# Altium footprint library PCBLIB.PcbLib: 775 footprints (part 48 of 49)
Each footprint in its own frame and in the unit in brackets; x right, y up, seen from the top. Pads: shape width x height; smd on the part's side, far side on the other; paste and mask are expansions set on the pad; w line width, h text height; cw(c..) or ccw(c..) is an arc to the next point about the centre after c.
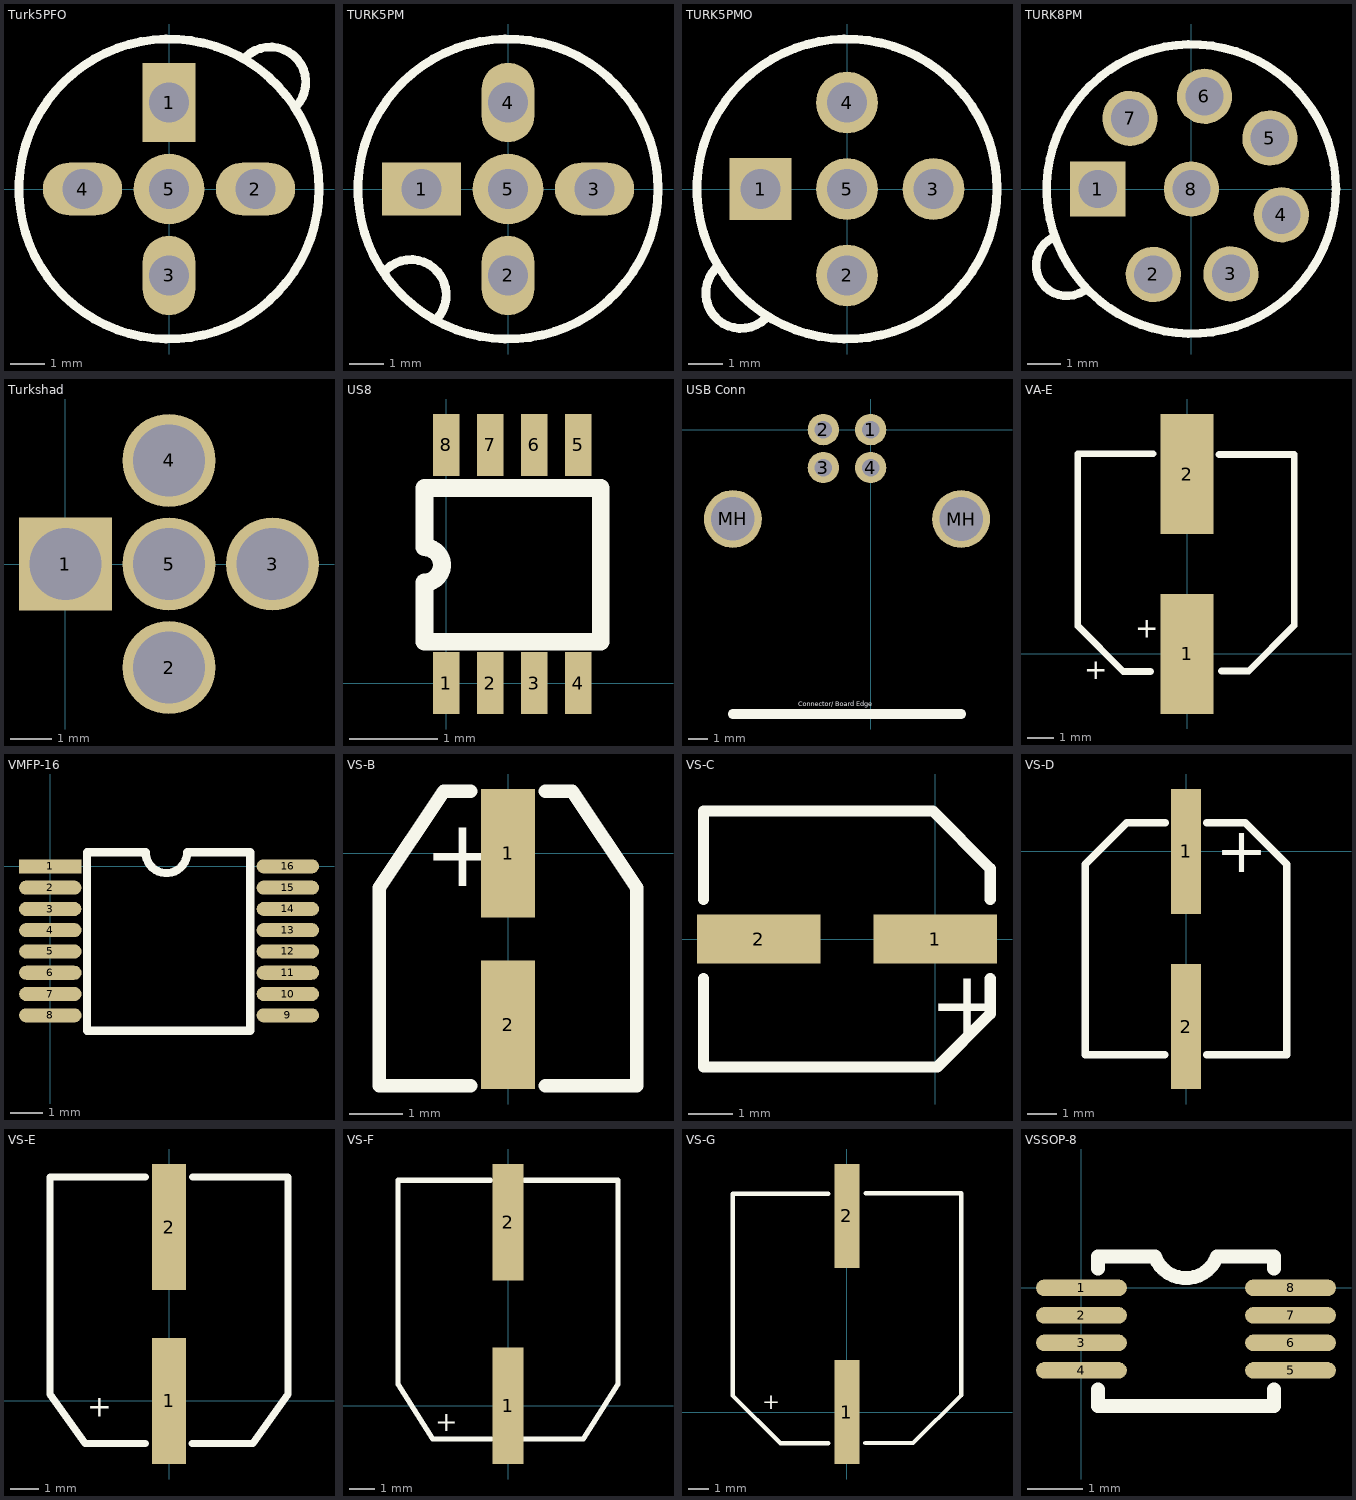
[diagram p47: the footprints below, top view; thin cyan lines are the x and y axes]

## Turk5PFO [mil]
pads (5):
  rect 60x90 hole 45: 1(0,98)
  oval 90x60 hole 45: 2(98,0) 4(-98,0)
  oval 60x90 hole 45: 3(0,-98)
  round 80 hole 45: 5(0,0)
TopOverlay:
  circle w10: c0,0 r170
  lines w10: 86.72,149.28 cw(c115,121) 143.28,92.72
Mechanical4:
  text "1.083" at 0,0 h1
  text "1.370" at 0,98 h1

## TURK5PM [mil]
pads (5):
  rect 90x60 hole 45: 1(-98,0)
  oval 60x90 hole 45: 2(0,-98) 4(0,98)
  oval 90x60 hole 45: 3(98,0)
  round 80 hole 45: 5(0,0)
TopOverlay:
  circle w10: c0,0 r170
  lines w10: -138.28,-91.72 cw(c-110,-120) -81.72,-148.28
Mechanical4:
  text "1.370" at -98,0 h1
  text "1.083" at 0,0 h1

## TURK5PMO [mil]
pads (5):
  rect 70x70 hole 45: 1(-98,0)
  round 70 hole 45: 2(0,-98) 3(98,0) 4(0,98) 5(0,0)
TopOverlay:
  circle w10: c0,0 r170
  lines w10: -148.28,-89.72 ccw(c-120,-118) -91.72,-146.28
BottomOverlay:
  circle w10: c0,0 r170
  lines w10: -148.28,-89.72 ccw(c-120,-118) -91.72,-146.28
Mechanical4:
  text "1.370" at -98,0 h1
  text "1.083" at 0,0 h1

## TURK8PM [mil]
pads (8):
  rect 65x65 hole 45: 1(-110,0)
  round 65 hole 45: 2(-44.74,-100.49) 3(46.49,-99.69) 4(105.74,-30.32) 5(92.25,59.91) 6(15.31,108.93) 7(-72.17,83.02) 8(0,0)
TopOverlay:
  circle w10: c0,0 r170
  lines w10: -163.45,-57.43 ccw(c-146.45,-89.43) -127,-120
Mechanical4:
  text "1.370" at 0,0 h1

## Turkshad [mil]
pads (5):
  rect 88x88 hole 68: 1(0,0)
  round 88 hole 68: 2(98,-98) 3(196,0) 4(98,98) 5(98,0)
Mechanical4:
  text "1.083" at 98,0 h1
  text ".4" at 0,0 h1

## US8 [mm]
pads (8):
  rect 0.3x0.7 smd: 1(0,0) 2(0.5,0) 3(1,0) 4(1.5,0) 5(1.5,2.7) 6(1,2.7) 7(0.5,2.7) 8(0,2.7)
TopOverlay:
  lines w0.203: -0.247,0.469 1.753,0.469 1.753,2.21 -0.247,2.21 -0.247,1.54 cw(c-0.247,1.34) -0.247,1.14 -0.247,0.469

## USB Conn [mil]
pads (6):
  round 65 hole 36.2: 1(0,0) 2(-98.4,0) 3(-98.4,-78.7) 4(0,-78.7)
  round 120 hole 90.6: MH(-286.22,-185.43) MH(187.8,-185.63)
TopOverlay:
  lines w20: -286.22,-590.55 187.79,-590.55
  text "Connector/ Board Edge" at -150.6,-573.96 h10

## VA-E [mil]
pads (2):
  rect 78x177.16 smd: 1(0,0) 2(0,265)
TopOverlay:
  lines w10: -54,-26 -94,-26 -161,41 -161,295 -50,295 ; 47,294 158,294 158,42 91,-25 51,-25
  text "+" at -76,24 h30
  text "+" at -151.57,-37.24 h30

## VMFP-16 [mm]
height 2
pads (16):
  rect 1.905x0.43 smd: 1(0,0)
  oval 1.905x0.43 smd: 2(-0.003,-0.65) 3(-0.004,-1.304) 4(0,-1.95) 5(0,-2.6) 6(0,-3.25) 7(0,-3.9) 8(0,-4.55) 9(7.255,-4.55) 10(7.255,-3.9) 11(7.255,-3.25) 12(7.255,-2.6) 13(7.255,-1.95) 14(7.255,-1.3) 15(7.255,-0.65) 16(7.255,0)
TopOverlay:
  lines w0.254: 1.119,-5.021 6.112,-5.021 6.112,0.429 4.181,0.429 cw(c3.546,0.429) 2.911,0.429 1.119,0.429 1.119,-5.021

## VS-B [mm]
pads (2):
  rect 1x2.4 smd: 1(0,0) 2(0,-3.2)
TopOverlay:
  lines w0.254: -0.7,-4.342 -2.4,-4.342 -2.4,-0.992 -2.4,-0.642 -1.2,1.158 -0.7,1.158 ; 0.7,-4.342 2.4,-4.342 2.4,-0.992 2.4,-0.642 1.2,1.158 0.7,1.158
  text "+" at -1.568,-0.618 h1.27
Mechanical4:
  text ".225" at 0,0 h0.03

## VS-C [mm]
height 10.439
pads (2):
  rect 2.8x1.1 smd: 1(0,0) 2(-4,0)
TopOverlay:
  lines w0.254: -5.254,-0.9 -5.254,-2.9 -0.704,-2.9 0.046,-2.9 1.246,-1.7 1.246,-0.9 ; -5.254,0.9 -5.254,2.9 -0.704,2.9 -0.054,2.9 1.246,1.6 1.246,0.9
  text "+" at -0.149,-2.205 h1.52
Mechanical4:
  text ".235" at -4,0 h0.03

## VS-D [mm]
pads (2):
  rect 1x4.208 smd: 1(0,0) 2(0,-5.908)
TopOverlay:
  lines w0.254: -0.717,-6.858 -0.92,-6.858 -3.4,-6.858 -3.4,-0.954 -3.4,-0.854 -3.4,-0.435 -2,0.965 -0.7,0.965 ; 0.7,0.965 2,0.965 3.4,-0.435 3.4,-0.954 ; 0.706,-6.858 0.869,-6.858 3.4,-6.858 3.4,-0.954 ; 3.4,-0.854 3.4,-0.954
  text "+" at 1.008,-0.701 h1.52
Mechanical4:
  text ".235" at 0,-0.454 h0.03

## VS-E [mm]
pads (2):
  rect 1.2x4.5 smd: 1(0,0) 2(0,6.2)
TopOverlay:
  lines w0.254: -0.846,7.984 -4.25,7.984 -4.25,0.484 -4.25,0.234 -3,-1.516 -0.836,-1.516 ; 0.831,-1.516 3,-1.516 4.25,0.234 4.25,0.484 4.25,7.984 0.841,7.984
  text "+" at -2.921,-0.559 h0.76
Mechanical4:
  text ".402" at 0,-1.016 h0.03

## VS-F [mm]
pads (2):
  rect 1.2x4.5 smd: 1(0,0) 2(0,7.1)
TopOverlay:
  lines w0.203: -0.686,8.718 -4.25,8.718 -4.25,0.822 -2.912,-1.282 -0.635,-1.282 ; 0.61,-1.282 2.912,-1.282 4.25,0.822 4.25,8.718 0.635,8.718
  text "+" at -2.819,-0.991 h0.76
Mechanical4:
  text ".402" at 0,-0.432 h0.03

## VS-G [mm]
pads (2):
  rect 1.2x5 smd: 1(0,0) 2(0,9.433)
TopOverlay:
  lines w0.203: -5.5,1.61 -5.5,10.5 -0.9,10.5 ; -5.5,1.915 -5.5,0.8 -3.2,-1.5 -0.9,-1.5 ; 0.875,-1.489 3.175,-1.489 5.5,0.811 5.5,3.134 ; 0.9,10.525 5.5,10.525 5.5,1.61
  text "+" at -4.078,0.137 h0.76
Mechanical4:
  text ".402" at -0.318,1.356 h0.03

## VSSOP-8 [mm]
height 0.9
pads (8):
  oval 1.651x0.3 smd mask+0.051: 1(0,0) 2(0,-0.5) 3(0,-1) 4(0,-1.5) 5(3.8,-1.5) 6(3.8,-1) 7(3.8,-0.5) 8(3.8,0)
TopOverlay:
  lines w0.254: 0.3,-1.85 0.3,-2.15 3.5,-2.15 3.5,-1.85 ; 0.3,0.35 0.3,0.57 1.335,0.57 ccw(c1.899,0.775) 2.463,0.57 3.5,0.57 3.5,0.35